# Altium footprint library CONNECTOR HDR.PcbLib: 338 footprints (part 19 of 22)
Each footprint in its own frame and in the unit in brackets; x right, y up, seen from the top. Pads: shape width x height; smd on the part's side, far side on the other; paste and mask are expansions set on the pad; w line width, h text height; cw(c..) or ccw(c..) is an arc to the next point about the centre after c.
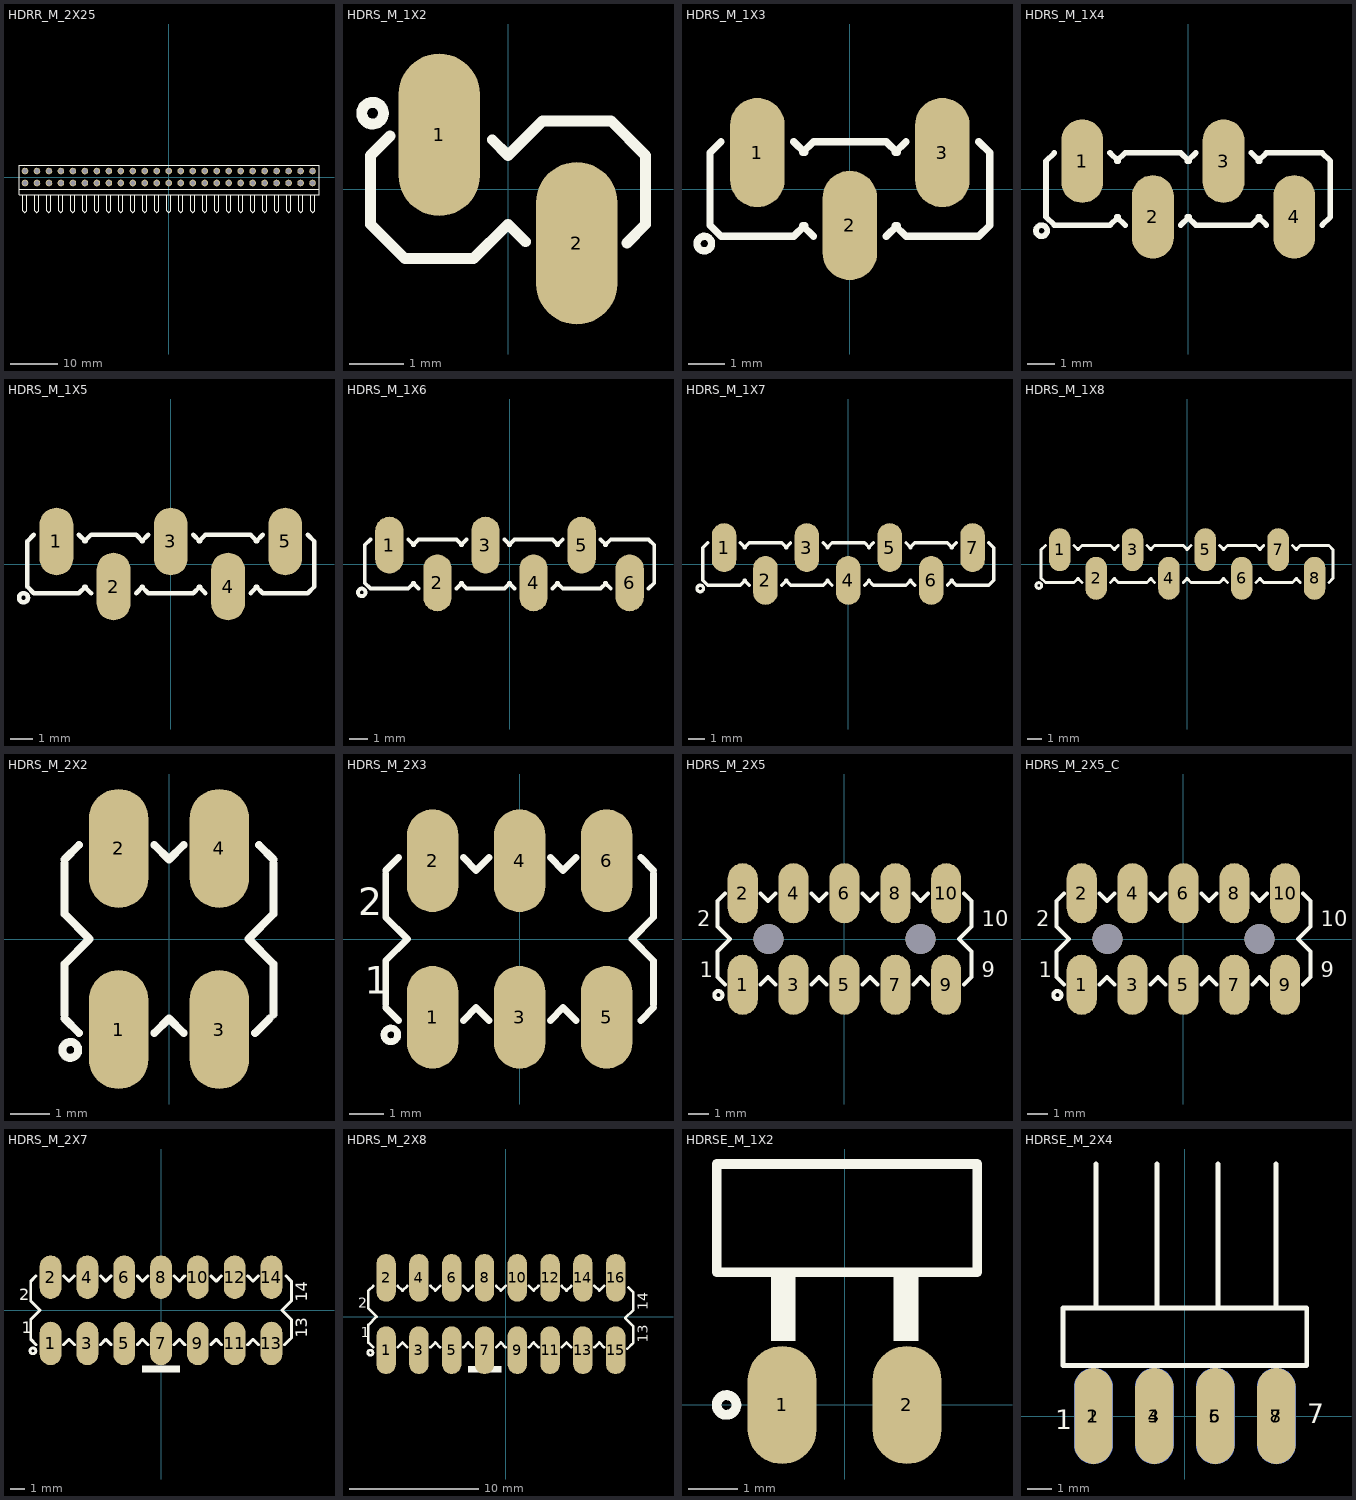
[diagram p18: the footprints below, top view; thin cyan lines are the x and y axes]

## HDRR_M_2X25 [mm] "Connector; Header; 25x2 Position"
height 7
pads (50):
  round 1.4 / inner round 1.4 / far side oval 1.4x2.2 hole 1: 1(-30.48,-1.27) 2(-30.48,1.27) 3(-27.94,-1.27) 4(-27.94,1.27) 5(-25.4,-1.27) 6(-25.4,1.27) 7(-22.86,-1.27) 8(-22.86,1.27) 9(-20.32,-1.27) 10(-20.32,1.27) 11(-17.78,-1.27) 12(-17.78,1.27) 13(-15.24,-1.27) 14(-15.24,1.27) 15(-12.7,-1.27) 16(-12.7,1.27) 17(-10.16,-1.27) 18(-10.16,1.27) 19(-7.62,-1.27) 20(-7.62,1.27) 21(-5.08,-1.27) 22(-5.08,1.27) 23(-2.54,-1.27) 24(-2.54,1.27) 25(0,-1.27) 26(0,1.27) 27(2.54,-1.27) 28(2.54,1.27) 29(5.08,-1.27) 30(5.08,1.27) 31(7.62,-1.27) 32(7.62,1.27) 33(10.16,-1.27) 34(10.16,1.27) 35(12.7,-1.27) 36(12.7,1.27) 37(15.24,-1.27) 38(15.24,1.27) 39(17.78,-1.27) 40(17.78,1.27) 41(20.32,-1.27) 42(20.32,1.27) 43(22.86,-1.27) 44(22.86,1.27) 45(25.4,-1.27) 46(25.4,1.27) 47(27.94,-1.27) 48(27.94,1.27) 49(30.48,-1.27) 50(30.48,1.27)
Top Overlay:
  lines w0.2: -30.903,-3.81 -30.903,-7.197 -30.48,-7.62 -30.057,-7.197 -30.057,-3.81 ; -28.363,-3.81 -28.363,-7.197 -27.94,-7.62 -27.517,-7.197 -27.517,-3.81 ; -25.823,-3.81 -25.823,-7.197 -25.4,-7.62 -24.977,-7.197 -24.977,-3.81 ; -23.283,-3.81 -23.283,-7.197 -22.86,-7.62 -22.437,-7.197 -22.437,-3.81 ; -20.743,-3.81 -20.743,-7.197 -20.32,-7.62 -19.897,-7.197 -19.897,-3.81 ; -18.203,-3.81 -18.203,-7.197 -17.78,-7.62 -17.357,-7.197 -17.357,-3.81 ; -15.663,-3.81 -15.663,-7.197 -15.24,-7.62 -14.817,-7.197 -14.817,-3.81 ; -13.123,-3.81 -13.123,-7.197 -12.7,-7.62 -12.277,-7.197 -12.277,-3.81 ; -10.583,-3.81 -10.583,-7.197 -10.16,-7.62 -9.737,-7.197 -9.737,-3.81 ; -8.043,-3.81 -8.043,-7.197 -7.62,-7.62 -7.197,-7.197 -7.197,-3.81 ; -5.503,-3.81 -5.503,-7.197 -5.08,-7.62 -4.657,-7.197 -4.657,-3.81 ; -2.963,-3.81 -2.963,-7.197 -2.54,-7.62 -2.117,-7.197 -2.117,-3.81 ; -0.423,-3.81 -0.423,-7.197 0,-7.62 0.423,-7.197 0.423,-3.81 ; 2.117,-3.81 2.117,-7.197 2.54,-7.62 2.963,-7.197 2.963,-3.81 ; 4.657,-3.81 4.657,-7.197 5.08,-7.62 5.503,-7.197 5.503,-3.81 ; 7.197,-3.81 7.197,-7.197 7.62,-7.62 8.043,-7.197 8.043,-3.81 ; 9.737,-3.81 9.737,-7.197 10.16,-7.62 10.583,-7.197 10.583,-3.81 ; 12.277,-3.81 12.277,-7.197 12.7,-7.62 13.123,-7.197 13.123,-3.81 ; 14.817,-3.81 14.817,-7.197 15.24,-7.62 15.663,-7.197 15.663,-3.81 ; 17.357,-3.81 17.357,-7.197 17.78,-7.62 18.203,-7.197 18.203,-3.81 ; 19.897,-3.81 19.897,-7.197 20.32,-7.62 20.743,-7.197 20.743,-3.81 ; 22.437,-3.81 22.437,-7.197 22.86,-7.62 23.283,-7.197 23.283,-3.81 ; 24.977,-3.81 24.977,-7.197 25.4,-7.62 25.823,-7.197 25.823,-3.81 ; 27.517,-3.81 27.517,-7.197 27.94,-7.62 28.363,-7.197 28.363,-3.81 ; 30.057,-3.81 30.057,-7.197 30.48,-7.62 30.903,-7.197 30.903,-3.81 ; -31.75,-2.54 31.85,-2.54 ; -31.75,-2.54 -31.75,-3.81 31.85,-3.81 31.85,-2.54 ; -31.75,-2.54 -31.75,2.54 31.85,2.54 31.85,-2.54
3D body: height 5.45, standoff -3, extent 29.21,-8.62 31.75,0
3D body: height 7.99, standoff -3, extent 29.21,-8.62 31.75,2.54
3D body: height 5.45, standoff -3, extent 26.67,-8.62 29.21,0
3D body: height 7.99, standoff -3, extent 26.67,-8.62 29.21,2.54
3D body: height 5.45, standoff -3, extent 24.13,-8.62 26.67,0
3D body: height 7.99, standoff -3, extent 24.13,-8.62 26.67,2.54
3D body: height 5.45, standoff -3, extent 21.59,-8.62 24.13,0
3D body: height 7.99, standoff -3, extent 21.59,-8.62 24.13,2.54
3D body: height 5.45, standoff -3, extent 19.05,-8.62 21.59,0
3D body: height 7.99, standoff -3, extent 19.05,-8.62 21.59,2.54
3D body: height 5.45, standoff -3, extent -31.75,-8.62 -29.21,0
3D body: height 7.99, standoff -3, extent -31.75,-8.62 -29.21,2.54
3D body: height 7.99, standoff -3, extent -29.21,-8.62 -26.67,2.54
3D body: height 5.45, standoff -3, extent -29.21,-8.62 -26.67,0
3D body: height 5.45, standoff -3, extent -26.67,-8.62 -24.13,0
3D body: height 7.99, standoff -3, extent -26.67,-8.62 -24.13,2.54
3D body: height 7.99, standoff -3, extent -24.13,-8.62 -21.59,2.54
3D body: height 5.45, standoff -3, extent -24.13,-8.62 -21.59,0
3D body: height 5.45, standoff -3, extent -21.59,-8.62 -19.05,0
3D body: height 7.99, standoff -3, extent -21.59,-8.62 -19.05,2.54
3D body: height 7.99, standoff -3, extent -19.05,-8.62 -16.51,2.54
3D body: height 5.45, standoff -3, extent -19.05,-8.62 -16.51,0
3D body: height 5.45, standoff -3, extent -16.51,-8.62 -13.97,0
3D body: height 7.99, standoff -3, extent -16.51,-8.62 -13.97,2.54
3D body: height 7.99, standoff -3, extent -13.97,-8.62 -11.43,2.54
3D body: height 5.45, standoff -3, extent -13.97,-8.62 -11.43,0
3D body: height 5.45, standoff -3, extent -11.43,-8.62 -8.89,0
3D body: height 7.99, standoff -3, extent -11.43,-8.62 -8.89,2.54
3D body: height 7.99, standoff -3, extent -8.89,-8.62 -6.35,2.54
3D body: height 5.45, standoff -3, extent -8.89,-8.62 -6.35,0
3D body: height 5.45, standoff -3, extent -6.35,-8.62 -3.81,0
3D body: height 7.99, standoff -3, extent -6.35,-8.62 -3.81,2.54
3D body: height 7.99, standoff -3, extent -3.81,-8.62 -1.27,2.54
3D body: height 5.45, standoff -3, extent -3.81,-8.62 -1.27,0
3D body: height 5.45, standoff -3, extent -1.27,-8.62 1.27,0
3D body: height 7.99, standoff -3, extent -1.27,-8.62 1.27,2.54
3D body: height 7.99, standoff -3, extent 1.27,-8.62 3.81,2.54
3D body: height 5.45, standoff -3, extent 1.27,-8.62 3.81,0
3D body: height 5.45, standoff -3, extent 3.81,-8.62 6.35,0
3D body: height 7.99, standoff -3, extent 3.81,-8.62 6.35,2.54
3D body: height 7.99, standoff -3, extent 6.35,-8.62 8.89,2.54
3D body: height 5.45, standoff -3, extent 6.35,-8.62 8.89,0
3D body: height 5.45, standoff -3, extent 8.89,-8.62 11.43,0
3D body: height 7.99, standoff -3, extent 8.89,-8.62 11.43,2.54
3D body: height 7.99, standoff -3, extent 11.43,-8.62 13.97,2.54
3D body: height 5.45, standoff -3, extent 11.43,-8.62 13.97,0
3D body: height 5.45, standoff -3, extent 13.97,-8.62 16.51,0
3D body: height 7.99, standoff -3, extent 13.97,-8.62 16.51,2.54
3D body: height 7.99, standoff -3, extent 16.51,-8.62 19.05,2.54
3D body: height 5.45, standoff -3, extent 16.51,-8.62 19.05,0

## HDRS_M_1X2 [mm]
pads (2):
  oval 1.5x3 smd: 1(-1.27,1) 2(1.27,-1)
Top Overlay:
  circle w0.2: c-2.5,1.4 r0.2
  lines w0.2: -2.18,0.98 -2.54,0.619 -2.54,-0.651 -1.905,-1.286 -0.635,-1.286 0,-0.651 0.325,-0.975 ; -0.29,0.91 0,0.619 0.635,1.254 1.905,1.254 2.54,0.619 2.54,-0.651 2.195,-0.995

## HDRS_M_1X3 [mm] "Connector; Header; 3 Position, SMD"
pads (3):
  oval 1.5x3 smd: 1(-2.54,1) 2(0,-1) 3(2.54,1)
Top Overlay:
  circle w0.2: c-4,-1.5 r0.2
  lines w0.2: -3.54,1.3 -3.84,1 -3.84,-1 -3.54,-1.3 -1.54,-1.3 -1.24,-1 ; -1.54,1.3 -1.24,1 ; -1.3,-1 -1,-1.3 ; -1.3,1 -1,1.3 1,1.3 1.3,1 ; 1,-1.3 1.3,-1 ; 1.24,-1 1.54,-1.3 3.54,-1.3 3.84,-1 3.84,1 3.54,1.3 ; 1.24,1 1.54,1.3
3D body: height 9.68, standoff 0.03, extent -3.81,-2.4 3.81,2.4

## HDRS_M_1X4 [mm] "Connector; Header; 4 Position, SMD"
pads (4):
  oval 1.5x3 smd: 1(-3.81,1) 2(-1.27,-1) 3(1.27,1) 4(3.81,-1)
Top Overlay:
  circle w0.2: c-5.27,-1.5 r0.2
  lines w0.2: -4.81,1.3 -5.11,1 -5.11,-1 -4.81,-1.3 -2.81,-1.3 -2.51,-1 ; -2.81,1.3 -2.51,1 ; -2.57,-1 -2.27,-1.3 ; -2.57,1 -2.27,1.3 -0.27,1.3 0.03,1 ; -0.27,-1.3 0.03,-1 ; -0.03,-1 0.27,-1.3 2.27,-1.3 2.57,-1 ; -0.03,1 0.27,1.3 ; 2.27,1.3 2.57,1 ; 2.51,-1 2.81,-1.3 ; 2.51,1 2.81,1.3 4.81,1.3 5.11,1 5.11,-1 4.81,-1.3
3D body: height 9.68, standoff 0.03, extent -5.08,-2.4 2.54,2.4
3D body: height 9.68, standoff 0.03, extent -2.54,-2.4 5.08,2.4

## HDRS_M_1X5 [mm] "Connector; Header; 5 Position, SMD"
pads (5):
  oval 1.5x3 smd: 1(-5.08,1) 2(-2.54,-1) 3(0,1) 4(2.54,-1) 5(5.08,1)
Top Overlay:
  circle w0.2: c-6.54,-1.5 r0.2
  lines w0.2: -6.08,1.3 -6.38,1 -6.38,-1 -6.08,-1.3 -4.08,-1.3 -3.78,-1 ; -4.08,1.3 -3.78,1 ; -3.84,-1 -3.54,-1.3 ; -3.84,1 -3.54,1.3 -1.54,1.3 -1.24,1 ; -1.54,-1.3 -1.24,-1 ; -1.3,-1 -1,-1.3 1,-1.3 1.3,-1 ; -1.3,1 -1,1.3 ; 1,1.3 1.3,1 ; 1.24,-1 1.54,-1.3 ; 1.24,1 1.54,1.3 3.54,1.3 3.84,1 ; 3.54,-1.3 3.84,-1 ; 3.78,-1 4.08,-1.3 6.08,-1.3 6.38,-1 6.38,1 6.08,1.3 ; 3.78,1 4.08,1.3
3D body: height 9.68, standoff 0.03, extent -1.27,-2.4 6.35,2.4
3D body: height 9.68, standoff 0.03, extent -6.35,-2.4 1.27,2.4
3D body: height 9.68, standoff 0.03, extent -3.81,-2.4 3.81,2.4

## HDRS_M_1X6 [mm] "Connector; Header; 6 Position, SMD"
pads (6):
  oval 1.5x3 smd: 1(-6.35,1) 2(-3.81,-1) 3(-1.27,1) 4(1.27,-1) 5(3.81,1) 6(6.35,-1)
Top Overlay:
  circle w0.2: c-7.81,-1.5 r0.2
  lines w0.2: -7.35,1.3 -7.65,1 -7.65,-1 -7.35,-1.3 -5.35,-1.3 -5.05,-1 ; -5.35,1.3 -5.05,1 ; -5.11,-1 -4.81,-1.3 ; -5.11,1 -4.81,1.3 -2.81,1.3 -2.51,1 ; -2.81,-1.3 -2.51,-1 ; -2.57,-1 -2.27,-1.3 -0.27,-1.3 0.03,-1 ; -2.57,1 -2.27,1.3 ; -0.27,1.3 0.03,1 ; -0.03,-1 0.27,-1.3 ; -0.03,1 0.27,1.3 2.27,1.3 2.57,1 ; 2.27,-1.3 2.57,-1 ; 2.51,-1 2.81,-1.3 4.81,-1.3 5.11,-1 ; 2.51,1 2.81,1.3 ; 4.81,1.3 5.11,1 ; 5.05,-1 5.35,-1.3 ; 5.05,1 5.35,1.3 7.35,1.3 7.65,1 7.65,-1 7.35,-1.3
3D body: height 9.68, standoff 0.03, extent -7.62,-2.4 0,2.4
3D body: height 9.68, standoff 0.03, extent 0,-2.4 7.62,2.4

## HDRS_M_1X7 [mm] "Connector; Header; 7 Position, SMD"
pads (7):
  oval 1.5x3 smd: 1(-7.62,1) 2(-5.08,-1) 3(-2.54,1) 4(0,-1) 5(2.54,1) 6(5.08,-1) 7(7.62,1)
Top Overlay:
  circle w0.2: c-9.08,-1.5 r0.2
  lines w0.2: -8.62,1.3 -8.92,1 -8.92,-1 -8.62,-1.3 -6.62,-1.3 -6.32,-1 ; -6.62,1.3 -6.32,1 ; -6.38,-1 -6.08,-1.3 ; -6.38,1 -6.08,1.3 -4.08,1.3 -3.78,1 ; -4.08,-1.3 -3.78,-1 ; -3.84,-1 -3.54,-1.3 -1.54,-1.3 -1.24,-1 ; -3.84,1 -3.54,1.3 ; -1.54,1.3 -1.24,1 ; -1.3,-1 -1,-1.3 ; -1.3,1 -1,1.3 1,1.3 1.3,1 ; 1,-1.3 1.3,-1 ; 1.24,-1 1.54,-1.3 3.54,-1.3 3.84,-1 ; 1.24,1 1.54,1.3 ; 3.54,1.3 3.84,1 ; 3.78,-1 4.08,-1.3 ; 3.78,1 4.08,1.3 6.08,1.3 6.38,1 ; 6.08,-1.3 6.38,-1 ; 6.32,-1 6.62,-1.3 8.62,-1.3 8.92,-1 8.92,1 8.62,1.3 ; 6.32,1 6.62,1.3
3D body: height 9.68, standoff 0.03, extent 1.27,-2.4 8.89,2.4
3D body: height 9.68, standoff 0.03, extent -1.27,-2.4 6.35,2.4
3D body: height 9.68, standoff 0.03, extent -8.89,-2.4 -1.27,2.4

## HDRS_M_1X8 [mm] "Connector; Header; 8 Position, SMD"
pads (8):
  oval 1.5x3 smd: 1(-8.89,1) 2(-6.35,-1) 3(-3.81,1) 4(-1.27,-1) 5(1.27,1) 6(3.81,-1) 7(6.35,1) 8(8.89,-1)
Top Overlay:
  circle w0.2: c-10.35,-1.5 r0.2
  lines w0.2: -9.89,1.3 -10.19,1 -10.19,-1 -9.89,-1.3 -7.89,-1.3 -7.59,-1 ; -7.89,1.3 -7.59,1 ; -7.65,-1 -7.35,-1.3 ; -7.65,1 -7.35,1.3 -5.35,1.3 -5.05,1 ; -5.35,-1.3 -5.05,-1 ; -5.11,-1 -4.81,-1.3 -2.81,-1.3 -2.51,-1 ; -5.11,1 -4.81,1.3 ; -2.81,1.3 -2.51,1 ; -2.57,-1 -2.27,-1.3 ; -2.57,1 -2.27,1.3 -0.27,1.3 0.03,1 ; -0.27,-1.3 0.03,-1 ; -0.03,-1 0.27,-1.3 2.27,-1.3 2.57,-1 ; -0.03,1 0.27,1.3 ; 2.27,1.3 2.57,1 ; 2.51,-1 2.81,-1.3 ; 2.51,1 2.81,1.3 4.81,1.3 5.11,1 ; 4.81,-1.3 5.11,-1 ; 5.05,-1 5.35,-1.3 7.35,-1.3 7.65,-1 ; 5.05,1 5.35,1.3 ; 7.35,1.3 7.65,1 ; 7.59,-1 7.89,-1.3 ; 7.59,1 7.89,1.3 9.89,1.3 10.19,1 10.19,-1 9.89,-1.3
3D body: height 9.68, standoff 0.03, extent 2.54,-2.4 10.16,2.4
3D body: height 9.68, standoff 0.03, extent 0,-2.4 7.62,2.4
3D body: height 9.68, standoff 0.03, extent -7.62,-2.4 0,2.4
3D body: height 9.68, standoff 0.03, extent -10.16,-2.4 -2.54,2.4

## HDRS_M_2X2 [mm]
pads (4):
  oval 1.5x3 smd: 1(-1.27,-2.286) 2(-1.27,2.286) 3(1.27,-2.286) 4(1.27,2.286)
Top Overlay:
  circle w0.2: c-2.49,-2.8 r0.2
  lines w0.2: -2.64,-2.005 -2.267,-2.378 ; -2.64,-1.905 -2.64,-0.635 -2.005,0 -2.64,0.635 -2.64,1.905 ; -2.64,2.005 -2.267,2.378 ; -0.373,-2.378 0,-2.005 0.373,-2.378 ; -0.373,2.378 0,2.005 0.373,2.378 ; 2.167,-2.378 2.54,-2.005 ; 2.267,2.378 2.64,2.005 ; 2.64,-1.905 2.64,-0.635 2.005,0 2.64,0.635 2.64,1.905
3D body: height 9.54, standoff -0.11, extent -2.54,-3.492 2.54,3.493

## HDRS_M_2X3 [mm] "Connector; Header; 3x2 Position, SMD"
pads (6):
  oval 1.5x3 smd: 1(-2.54,-2.286) 2(-2.54,2.286) 3(0,-2.286) 4(0,2.286) 5(2.54,-2.286) 6(2.54,2.286)
Top Overlay:
  circle w0.2: c-3.76,-2.8 r0.2
  lines w0.2: -3.91,-2.005 -3.537,-2.378 ; -3.91,-1.905 -3.91,-0.635 -3.275,0 -3.91,0.635 -3.91,1.905 ; -3.91,2.005 -3.537,2.378 ; -1.643,-2.378 -1.27,-2.005 -0.897,-2.378 ; -1.643,2.378 -1.27,2.005 -0.897,2.378 ; 0.897,-2.378 1.27,-2.005 1.643,-2.378 ; 0.897,2.378 1.27,2.005 1.643,2.378 ; 3.537,-2.378 3.91,-2.005 ; 3.537,2.378 3.91,2.005 ; 3.91,-1.905 3.91,-0.635 3.275,0 3.91,0.635 3.91,1.905
  text "1" at -4.52,-1.6 h0.8
  text "2" at -4.72,0.7 h0.8
3D body: height 9.54, standoff -0.11, extent -3.81,-3.492 3.81,3.493

## HDRS_M_2X5 [mm] "Male Header 2X05 with 2.54 mm SMD, TSM-105-01-X-DV-A"
pads (12):
  oval 1.5x3 smd: 1(-5.08,-2.286) 2(-5.08,2.286) 3(-2.54,-2.286) 4(-2.54,2.286) 5(0,-2.286) 6(0,2.286) 7(2.54,-2.286) 8(2.54,2.286) 9(5.08,-2.286) 10(5.08,2.286)
  round 1.5 hole 1.5 unplated mask+0.038: ""(-3.8,0) ""(3.8,0)
Top Overlay:
  circle w0.2: c-6.3,-2.8 r0.2
  lines w0.2: -5.977,-2.278 -6.35,-1.905 -6.35,-0.635 -5.715,0 -6.35,0.635 -6.35,1.905 -5.977,2.278 ; -4.183,-2.278 -3.81,-1.905 -3.437,-2.278 ; -4.183,2.278 -3.81,1.905 -3.437,2.278 ; -1.643,-2.278 -1.27,-1.905 -0.897,-2.278 ; -1.643,2.278 -1.27,1.905 -0.897,2.278 ; 0.897,-2.278 1.27,-1.905 1.643,-2.278 ; 0.897,2.278 1.27,1.905 1.643,2.278 ; 3.437,-2.278 3.81,-1.905 4.183,-2.278 ; 3.437,2.278 3.81,1.905 4.183,2.278 ; 5.977,-2.278 6.35,-1.905 6.35,-0.635 5.715,0 6.35,0.635 6.35,1.905 5.977,2.278
  text "2" at -7.366,0.635 h0.76
  text "1" at -7.239,-1.905 h0.76
  text "10" at 6.858,0.635 h0.76
  text "9" at 6.858,-1.905 h0.76
3D body: height 9.65, standoff -1.27, extent -6.35,-3.683 6.35,3.683

## HDRS_M_2X5_C [mm] "Male Header 2X05 with 2.54 mm SMD WITH CABLE"
pads (12):
  oval 1.5x3 smd: 1(-5.08,-2.286) 2(-5.08,2.286) 3(-2.54,-2.286) 4(-2.54,2.286) 5(0,-2.286) 6(0,2.286) 7(2.54,-2.286) 8(2.54,2.286) 9(5.08,-2.286) 10(5.08,2.286)
  round 1.5 hole 1.5 unplated mask+0.038: ""(-3.8,0) ""(3.8,0)
Top Overlay:
  circle w0.2: c-6.3,-2.8 r0.2
  lines w0.2: -5.977,-2.278 -6.35,-1.905 -6.35,-0.635 -5.715,0 -6.35,0.635 -6.35,1.905 -5.977,2.278 ; -4.183,-2.278 -3.81,-1.905 -3.437,-2.278 ; -4.183,2.278 -3.81,1.905 -3.437,2.278 ; -1.643,-2.278 -1.27,-1.905 -0.897,-2.278 ; -1.643,2.278 -1.27,1.905 -0.897,2.278 ; 0.897,-2.278 1.27,-1.905 1.643,-2.278 ; 0.897,2.278 1.27,1.905 1.643,2.278 ; 3.437,-2.278 3.81,-1.905 4.183,-2.278 ; 3.437,2.278 3.81,1.905 4.183,2.278 ; 5.977,-2.278 6.35,-1.905 6.35,-0.635 5.715,0 6.35,0.635 6.35,1.905 5.977,2.278
  text "9" at 6.858,-1.905 h0.76
  text "10" at 6.858,0.635 h0.76
  text "1" at -7.239,-1.905 h0.76
  text "2" at -7.366,0.635 h0.76
3D body: height 76.91, standoff 3.91, extent -8.696,-4.133 8.595,4.265
3D body: height 9.65, standoff -1.27, extent -6.35,-3.683 6.35,3.683

## HDRS_M_2X7 [mm]
pads (14):
  oval 1.5x3 smd: 1(-7.62,-2.286) 2(-7.62,2.286) 3(-5.08,-2.286) 4(-5.08,2.286) 5(-2.54,-2.286) 6(-2.54,2.286) 7(0,-2.286) 8(0,2.286) 9(2.54,-2.286) 10(2.54,2.286) 11(5.08,-2.286) 12(5.08,2.286) 13(7.62,-2.286) 14(7.62,2.286)
Top Overlay:
  circle w0.2: c-8.84,-2.8 r0.2
  rectangle: -1.3,-4.3 1.3,-3.8
  lines w0.2: -8.99,-2.005 -8.617,-2.378 ; -8.99,-1.905 -8.99,-0.635 -8.355,0 -8.99,0.635 -8.99,1.905 ; -8.99,2.005 -8.617,2.378 ; -6.723,-2.378 -6.35,-2.005 -5.977,-2.378 ; -6.723,2.378 -6.35,2.005 -5.977,2.378 ; -4.183,-2.378 -3.81,-2.005 -3.437,-2.378 ; -4.183,2.378 -3.81,2.005 -3.437,2.378 ; -1.643,-2.378 -1.27,-2.005 -0.897,-2.378 ; -1.643,2.378 -1.27,2.005 -0.897,2.378 ; 0.897,-2.378 1.27,-2.005 1.643,-2.378 ; 0.897,2.378 1.27,2.005 1.643,2.378 ; 3.437,-2.378 3.81,-2.005 4.183,-2.378 ; 3.437,2.378 3.81,2.005 4.183,2.378 ; 5.977,-2.378 6.35,-2.005 6.723,-2.378 ; 5.977,2.378 6.35,2.005 6.723,2.378 ; 8.517,-2.378 8.89,-2.005 ; 8.617,2.378 8.99,2.005 ; 8.99,-1.905 8.99,-0.635 8.355,0 8.99,0.635 8.99,1.905
  text "14" at 10.1,0.6 h0.8
  text "13" at 10.1,-1.9 h0.8
  text "2" at -9.8,0.7 h0.8
  text "1" at -9.6,-1.6 h0.8
3D body: height 9.54, standoff -0.11, extent -8.89,-3.492 8.89,3.493

## HDRS_M_2X8 [mm]
pads (16):
  oval 1.5x3.7 smd: 1(-9.271,-2.6) 2(-9.271,3) 3(-6.731,-2.6) 4(-6.731,3) 5(-4.191,-2.6) 6(-4.191,3) 7(-1.651,-2.6) 8(-1.651,3) 9(0.889,-2.6) 10(0.889,3) 11(3.429,-2.6) 12(3.429,3) 13(5.969,-2.6) 14(5.969,3) 15(8.509,-2.6) 16(8.509,3)
Top Overlay:
  circle w0.2: c-10.491,-2.8 r0.2
  rectangle: -2.921,-4.318 -0.321,-3.818
  lines w0.2: -10.641,-2.005 -10.268,-2.378 ; -10.641,-1.905 -10.641,-0.635 -10.006,0 -10.641,0.635 -10.641,1.905 ; -10.641,2.005 -10.268,2.378 ; -8.374,-2.378 -8.001,-2.005 -7.628,-2.378 ; -8.374,2.378 -8.001,2.005 -7.628,2.378 ; -5.834,-2.378 -5.461,-2.005 -5.088,-2.378 ; -5.834,2.378 -5.461,2.005 -5.088,2.378 ; -3.294,-2.378 -2.921,-2.005 -2.548,-2.378 ; -3.294,2.378 -2.921,2.005 -2.548,2.378 ; -0.754,-2.378 -0.381,-2.005 -0.008,-2.378 ; -0.754,2.378 -0.381,2.005 -0.008,2.378 ; 1.786,-2.378 2.159,-2.005 2.532,-2.378 ; 1.786,2.378 2.159,2.005 2.532,2.378 ; 4.326,-2.378 4.699,-2.005 5.072,-2.378 ; 4.326,2.378 4.699,2.005 5.072,2.378 ; 6.866,-2.378 7.239,-2.005 7.612,-2.378 ; 6.866,2.378 7.239,2.005 7.612,2.378 ; 9.406,-2.505 9.779,-2.132 ; 9.506,2.251 9.879,1.878 ; 9.879,-2.032 9.879,-0.762 9.244,-0.127 9.879,0.508 9.879,1.778
  text "1" at -11.251,-1.6 h0.8
  text "2" at -11.451,0.7 h0.8
  text "13" at 10.989,-2.027 h0.8
  text "14" at 10.989,0.473 h0.8
3D body: height 9.57, standoff -0.03, extent -10.541,-3.496 9.779,4.004

## HDRSE_M_1X2 [mm]
pads (2):
  oval 1.4x2.4 smd mask+0.1: 1(-1.27,0) 2(1.27,0)
Top Overlay:
  circle w0.2: c-2.4,0 r0.2
  region: 1.5,2.7 1,2.7 1,1.3 1.5,1.3
  rectangle: -1.5,1.3 -1,2.7
  lines w0.2: -2.6,2.7 -2.6,4.9 2.7,4.9 2.7,2.7 -2.6,2.7
3D body: height 1.54, standoff -0.94, extent -2.5,-0.47 2.58,11.07

## HDRSE_M_2X4 [mm] "Connector; Header; 4x2 Position, SMD, EDGE of Board"
height 7.01
pads (8):
  oval 1.6x4 smd: 1(-3.81,0) 3(-1.27,0) 5(1.27,0) 7(3.81,0)
  oval 1.6x4 smd far side: 2(-3.81,0) 4(-1.27,0) 6(1.27,0) 8(3.81,0)
Top Overlay:
  lines w0.2: -3.7,4.5 -3.7,10.5 ; -1.16,4.5 -1.16,10.5 ; 1.38,4.5 1.38,10.5 ; 3.8,4.5 3.8,10.5 ; -5.08,2.1 5.08,2.1 5.08,4.5 -5.08,4.5 -5.08,2.1
  text "1" at -5.411,-0.545 h0.8
  text "7" at 5.1,-0.3 h0.8
Bottom Overlay:
  text "8" at 5.037,-0.322 h0.8
  text "2" at -4.991,-0.511 h0.8
3D body: height -0.91, standoff -3.39, extent -5.09,-1 5.07,10.54
3D body: height 1.59, standoff -0.89, extent -5.08,-0.955 5.08,10.585